# Altium footprint library Arduino_StepperPrototype.PcbLib: 7 footprints
Each footprint in its own frame and in the unit in brackets; x right, y up, seen from the top. Pads: shape width x height; smd on the part's side, far side on the other; paste and mask are expansions set on the pad; w line width, h text height; cw(c..) or ccw(c..) is an arc to the next point about the centre after c.
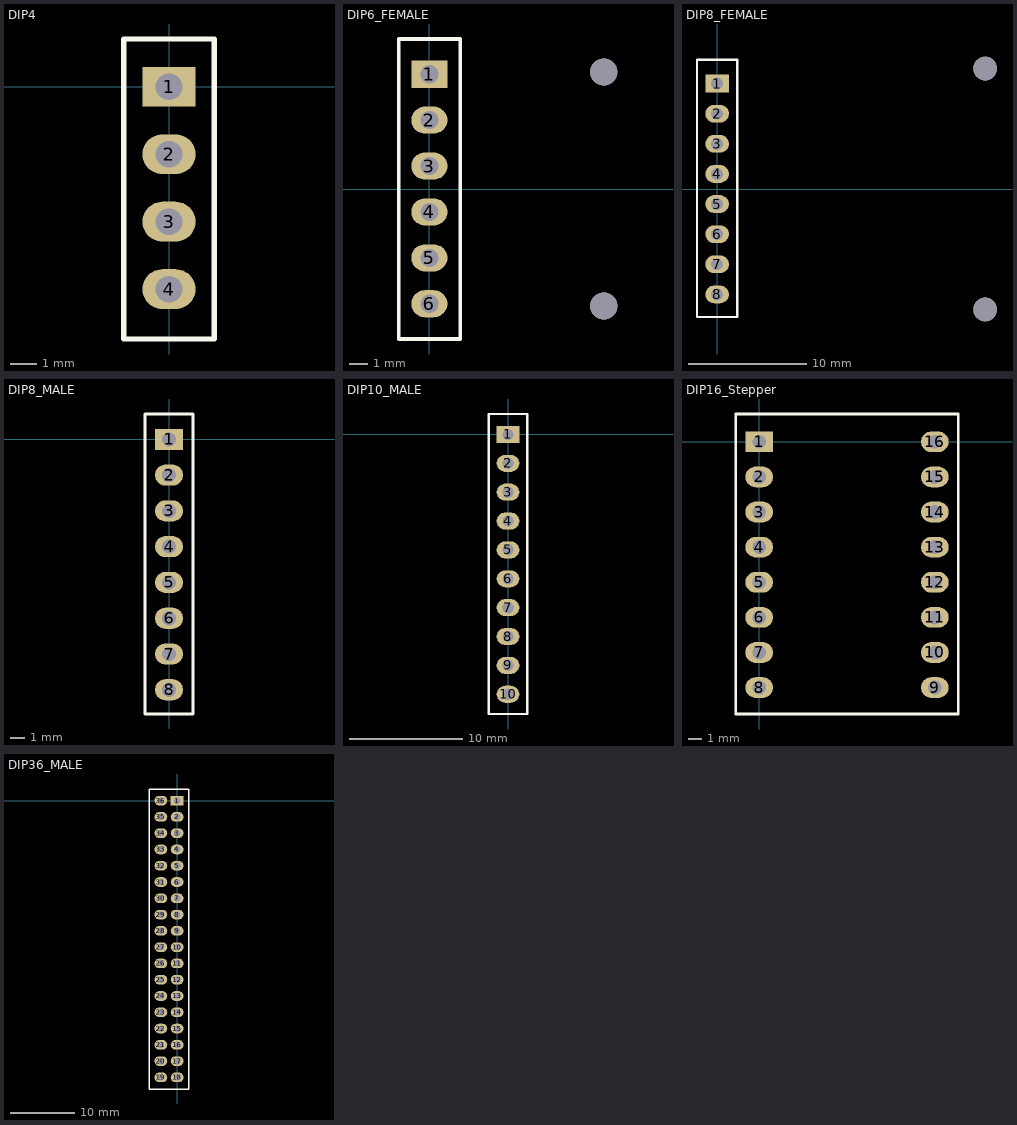
[diagram p0: the footprints below, top view; thin cyan lines are the x and y axes]

## DIP4 [mm]
pads (4):
  rect 2x1.5 hole 1: 1(0,0)
  oval 2x1.5 hole 1: 2(0,-2.54) 3(0,-5.08) 4(0,-7.62)
Top Overlay:
  lines w0.2: -1.7,-9.5 -1.7,1.8 1.7,1.8 1.7,-9.5 -1.7,-9.5

## DIP6_FEMALE [mm]
pads (8):
  rect 2x1.5 hole 1: 1(0,6.35)
  oval 2x1.5 hole 1: 2(0,3.81) 3(0,1.27) 4(0,-1.27) 5(0,-3.81) 6(0,-6.35)
  round 1.5 hole 1.5 unplated mask+0.5: ""(9.652,-6.477) ""(9.652,6.477)
Top Overlay:
  lines w0.2: -1.7,-8.3 1.7,-8.3 1.7,8.3 -1.7,8.3 -1.7,-8.3
3D body "Adafruit MCP4725.step": height 13.92, standoff 2.38, extent -2,-9 12,9
3D body "User Library-zl262-6s_p2-54_l15-74_w2-54_h8-5.step": height 8.5, standoff -3, extent -1.27,-7.87 1.27,7.87

## DIP8_FEMALE [mm]
pads (10):
  rect 2x1.5 hole 1: 1(0,8.89)
  oval 2x1.5 hole 1: 2(0,6.35) 3(0,3.81) 4(0,1.27) 5(0,-1.27) 6(0,-3.81) 7(0,-6.35) 8(0,-8.89)
  round 2 hole 2 unplated mask+0.5: ""(22.606,-10.16) ""(22.606,10.16)
Top Overlay:
  lines w0.2: -1.7,-10.8 1.7,-10.8 1.7,10.9 -1.7,10.9 -1.7,-10.8
3D body "Adafruit MAX31865.step": height 21.01, standoff 2.38, extent -2.7,-12.7 25.24,12.7
3D body "User Library-zl262-8s_p2-54_l20-82_w2-54_h8-5.step": height 8.5, standoff -3, extent -1.27,-10.41 1.27,10.41

## DIP8_MALE [mm]
pads (8):
  rect 2x1.5 hole 1: 1(0,0)
  oval 2x1.5 hole 1: 2(0,-2.54) 3(0,-5.08) 4(0,-7.62) 5(0,-10.16) 6(0,-12.7) 7(0,-15.24) 8(0,-17.78)
Top Overlay:
  lines w0.2: -1.7,-19.5 -1.7,1.8 1.7,1.8 1.7,-19.5 -1.7,-19.5
3D body "PREC008SAAN-RC.STEP": height 8.38, standoff -3.05, extent -1.265,-19.05 1.275,1.27

## DIP10_MALE [mm]
pads (10):
  rect 2x1.5 hole 1: 1(0,0)
  oval 2x1.5 hole 1: 2(0,-2.54) 3(0,-5.08) 4(0,-7.62) 5(0,-10.16) 6(0,-12.7) 7(0,-15.24) 8(0,-17.78) 9(0,-20.32) 10(0,-22.86)
Top Overlay:
  lines w0.2: -1.7,-24.6 -1.7,1.8 1.7,1.8 1.7,-24.6 -1.7,-24.6
3D body "PREC010SAAN-RC.STEP": height 8.38, standoff -3.05, extent -1.265,-24.13 1.275,1.27

## DIP16_Stepper [mm]
pads (16):
  rect 2x1.5 hole 1: 1(0,0)
  oval 2x1.5 hole 1: 2(0,-2.54) 3(0,-5.08) 4(0,-7.62) 5(0,-10.16) 6(0,-12.7) 7(0,-15.24) 8(0,-17.78) 9(12.7,-17.78) 10(12.7,-15.24) 11(12.7,-12.7) 12(12.7,-10.16) 13(12.7,-7.62) 14(12.7,-5.08) 15(12.7,-2.54) 16(12.7,0)
Top Overlay:
  lines w0.2: -1.7,-19.69 -1.7,2.01 14.4,2.01 14.4,-19.69 -1.7,-19.69
3D body "tmc2100.step": height 21.29, standoff 2.46, extent -1.27,-19.05 13.97,1.27
3D body "User Library-zl262-8s_p2-54_l20-82_w2-54_h8-5.step": height 8.5, standoff -3, extent -1.27,-19.3 1.27,1.52
3D body "User Library-zl262-8s_p2-54_l20-82_w2-54_h8-5.step": height 8.5, standoff -3, extent 11.43,-19.3 13.97,1.52

## DIP36_MALE [mm]
pads (36):
  rect 2x1.5 hole 1: 1(0,0)
  oval 2x1.5 hole 1: 2(0,-2.54) 3(0,-5.08) 4(0,-7.62) 5(0,-10.16) 6(0,-12.7) 7(0,-15.24) 8(0,-17.78) 9(0,-20.32) 10(0,-22.86) 11(0,-25.4) 12(0,-27.94) 13(0,-30.48) 14(0,-33.02) 15(0,-35.56) 16(0,-38.1) 17(0,-40.64) 18(0,-43.18) 19(-2.54,-43.18) 20(-2.54,-40.64) 21(-2.54,-38.1) 22(-2.54,-35.56) 23(-2.54,-33.02) 24(-2.54,-30.48) 25(-2.54,-27.94) 26(-2.54,-25.4) 27(-2.54,-22.86) 28(-2.54,-20.32) 29(-2.54,-17.78) 30(-2.54,-15.24) 31(-2.54,-12.7) 32(-2.54,-10.16) 33(-2.54,-7.62) 34(-2.54,-5.08) 35(-2.54,-2.54) 36(-2.54,0)
Top Overlay:
  lines w0.2: -4.37,-44.99 -4.37,1.81 1.83,1.81 1.83,-44.99 -4.37,-44.99
3D body "User Library-arduino_MEGA2650-1.STEP": height 15.4, standoff 0.15, extent -7.67,-50.76 100.28,2.58
3D body "36Pos2Raow.stp": height 9.26, standoff -2.89, extent -3.81,-44.45 1.27,1.27